# Altium schematic symbol library jlcpcb_2025_04_ferrites_extended_0603.schlib: 833 symbols (part 1 of 4)
Pins are listed as number, name and electrical type; pins without a type are passive.

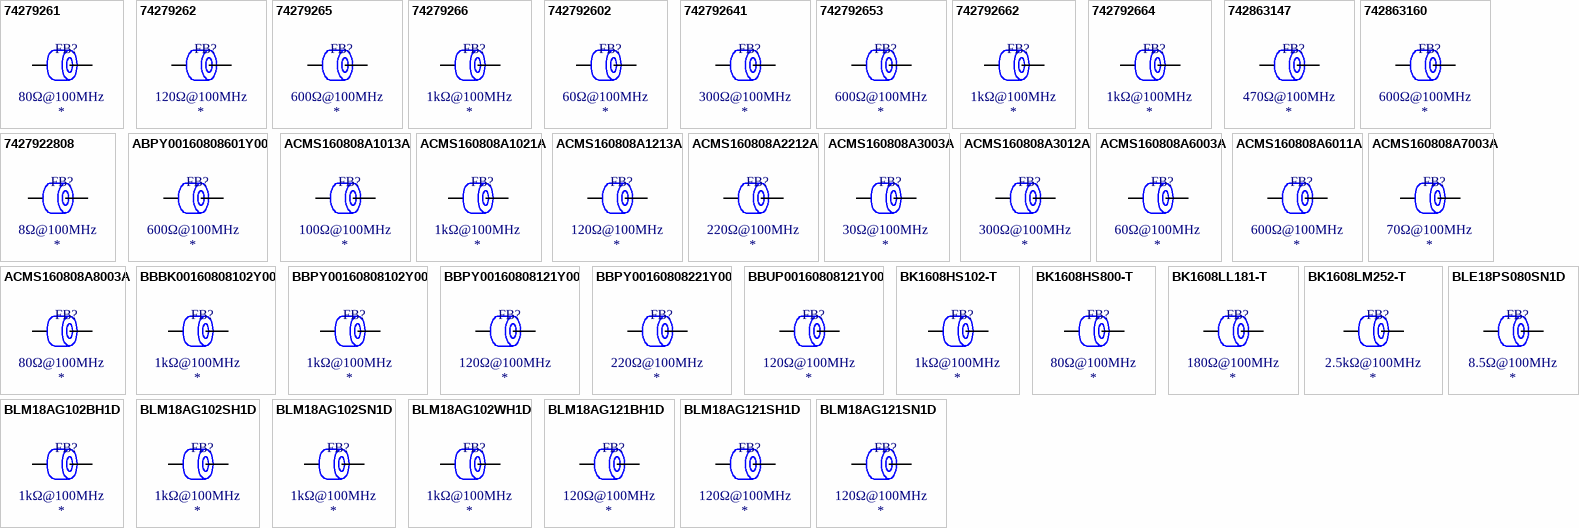
[diagram p0: symbols 74279261 to BLM18AG121SN1D]

## 74279261
designator FB?  Impedance @ Frequency: 80Ω@100MHz
Ferrite, 80Ω@100MHz, ±25%, 300mΩ, 1A, SMD 0603; Manufacturer: Wurth Elektronik; Manufacturer Part Number: 74279261; Package Size: 0603; JLCPCB Basic Part: No; JLCPCB Part Number: C2661853; Supplier 1: LCSC; Category: Ferrite Beads; Supplier Part Number 1: C2661853; Tolerance: ±25%; Rated Current: 1A; DC Resistance: 300mΩ; RoHS: Yes; ComponentLink1Description: Datasheet; ComponentLink1URL: https://wmsc.lcsc.com/wmsc/upload/file/pdf/v2/lcsc/2202131730_Wurth-Elektronik-74279261_C2661853.pdf; ComponentLink2Description: JLCPCB Part URL; ComponentLink2URL: https://jlcpcb.com/partdetail/C2661853; ComponentLink3Description: LCSC Part URL; ComponentLink3URL: https://lcsc.com/product-detail/Ferrite-Beads_Wurth-Elektronik-Wurth-Elektronik-74279261_C2661853.html
footprint FB-0603 (0603 (1608M) Ferrite)
pins: 1, 2

## 74279262
designator FB?  Impedance @ Frequency: 120Ω@100MHz
Ferrite, 120Ω@100MHz, ±25%, 300mΩ, 1.35A, SMD 0603; Manufacturer: Wurth Elektronik; Manufacturer Part Number: 74279262; Package Size: 0603; JLCPCB Basic Part: No; JLCPCB Part Number: C2661432; Supplier 1: LCSC; Category: Ferrite Beads; Supplier Part Number 1: C2661432; Tolerance: ±25%; Rated Current: 1.35A; DC Resistance: 300mΩ; RoHS: Yes; ComponentLink1Description: Datasheet; ComponentLink1URL: https://wmsc.lcsc.com/wmsc/upload/file/pdf/v2/lcsc/2106080004_Wurth-Elektronik-74279262_C2661432.pdf; ComponentLink2Description: JLCPCB Part URL; ComponentLink2URL: https://jlcpcb.com/partdetail/C2661432; ComponentLink3Description: LCSC Part URL; ComponentLink3URL: https://lcsc.com/product-detail/Ferrite-Beads_Wurth-Elektronik-Wurth-Elektronik-74279262_C2661432.html
footprint FB-0603 (0603 (1608M) Ferrite)
pins: 1, 2

## 74279265
designator FB?  Impedance @ Frequency: 600Ω@100MHz
Ferrite, 600Ω@100MHz, ±25%, 450mΩ, 850mA, SMD 0603; Manufacturer: Wurth Elektronik; Manufacturer Part Number: 74279265; Package Size: 0603; JLCPCB Basic Part: No; JLCPCB Part Number: C2661703; Supplier 1: LCSC; Category: Ferrite Beads; Supplier Part Number 1: C2661703; Tolerance: ±25%; Rated Current: 850mA; DC Resistance: 450mΩ; RoHS: Yes; ComponentLink1Description: Datasheet; ComponentLink1URL: https://wmsc.lcsc.com/wmsc/upload/file/pdf/v2/lcsc/2106071805_Wurth-Elektronik-74279265_C2661703.pdf; ComponentLink2Description: JLCPCB Part URL; ComponentLink2URL: https://jlcpcb.com/partdetail/C2661703; ComponentLink3Description: LCSC Part URL; ComponentLink3URL: https://lcsc.com/product-detail/Ferrite-Beads_Wurth-Elektronik-Wurth-Elektronik-74279265_C2661703.html
footprint FB-0603 (0603 (1608M) Ferrite)
pins: 1, 2

## 74279266
designator FB?  Impedance @ Frequency: 1kΩ@100MHz
Ferrite, 1kΩ@100MHz, ±25%, 600mΩ, 650mA, SMD 0603; Manufacturer: Wurth Elektronik; Manufacturer Part Number: 74279266; Package Size: 0603; JLCPCB Basic Part: No; JLCPCB Part Number: C2649309; Supplier 1: LCSC; Category: Ferrite Beads; Supplier Part Number 1: C2649309; Tolerance: ±25%; Rated Current: 650mA; DC Resistance: 600mΩ; RoHS: Yes; ComponentLink1Description: Datasheet; ComponentLink1URL: https://wmsc.lcsc.com/wmsc/upload/file/pdf/v2/lcsc/2108070630_Wurth-Elektronik-74279266_C2649309.pdf; ComponentLink2Description: JLCPCB Part URL; ComponentLink2URL: https://jlcpcb.com/partdetail/C2649309; ComponentLink3Description: LCSC Part URL; ComponentLink3URL: https://lcsc.com/product-detail/Ferrite-Beads_Wurth-Elektronik-Wurth-Elektronik-74279266_C2649309.html
footprint FB-0603 (0603 (1608M) Ferrite)
pins: 1, 2

## 742792602
designator FB?  Impedance @ Frequency: 60Ω@100MHz
Ferrite, 60Ω@100MHz, ±25%, 40mΩ, 3A, SMD 0603; Manufacturer: Wurth Elektronik; Manufacturer Part Number: 742792602; Package Size: 0603; JLCPCB Basic Part: No; JLCPCB Part Number: C2661495; Supplier 1: LCSC; Category: Ferrite Beads; Supplier Part Number 1: C2661495; Tolerance: ±25%; Rated Current: 3A; DC Resistance: 40mΩ; RoHS: Yes; ComponentLink1Description: Datasheet; ComponentLink1URL: https://wmsc.lcsc.com/wmsc/upload/file/pdf/v2/lcsc/2106071806_Wurth-Elektronik-742792602_C2661495.pdf; ComponentLink2Description: JLCPCB Part URL; ComponentLink2URL: https://jlcpcb.com/partdetail/C2661495; ComponentLink3Description: LCSC Part URL; ComponentLink3URL: https://lcsc.com/product-detail/Ferrite-Beads_Wurth-Elektronik-Wurth-Elektronik-742792602_C2661495.html
footprint FB-0603 (0603 (1608M) Ferrite)
pins: 1, 2

## 742792641
designator FB?  Impedance @ Frequency: 300Ω@100MHz
Ferrite, 300Ω@100MHz, ±25%, 150mΩ, 2A, SMD 0603; Manufacturer: Wurth Elektronik; Manufacturer Part Number: 742792641; Package Size: 0603; JLCPCB Basic Part: No; JLCPCB Part Number: C2649308; Supplier 1: LCSC; Category: Ferrite Beads; Supplier Part Number 1: C2649308; Tolerance: ±25%; Rated Current: 2A; DC Resistance: 150mΩ; RoHS: Yes; ComponentLink1Description: Datasheet; ComponentLink1URL: https://wmsc.lcsc.com/wmsc/upload/file/pdf/v2/lcsc/2106080533_Wurth-Elektronik-742792641_C2649308.pdf; ComponentLink2Description: JLCPCB Part URL; ComponentLink2URL: https://jlcpcb.com/partdetail/C2649308; ComponentLink3Description: LCSC Part URL; ComponentLink3URL: https://lcsc.com/product-detail/Ferrite-Beads_Wurth-Elektronik-Wurth-Elektronik-742792641_C2649308.html
footprint FB-0603 (0603 (1608M) Ferrite)
pins: 1, 2

## 742792653
designator FB?  Impedance @ Frequency: 600Ω@100MHz
Ferrite, 600Ω@100MHz, ±25%, 650mΩ, 500mA, SMD 0603; Manufacturer: Wurth Elektronik; Manufacturer Part Number: 742792653; Package Size: 0603; JLCPCB Basic Part: No; JLCPCB Part Number: C2661765; Supplier 1: LCSC; Category: Ferrite Beads; Supplier Part Number 1: C2661765; Tolerance: ±25%; Rated Current: 500mA; DC Resistance: 650mΩ; RoHS: Yes; ComponentLink1Description: Datasheet; ComponentLink1URL: https://wmsc.lcsc.com/wmsc/upload/file/pdf/v2/lcsc/2108070930_Wurth-Elektronik-742792653_C2661765.pdf; ComponentLink2Description: JLCPCB Part URL; ComponentLink2URL: https://jlcpcb.com/partdetail/C2661765; ComponentLink3Description: LCSC Part URL; ComponentLink3URL: https://lcsc.com/product-detail/Ferrite-Beads_Wurth-Elektronik-Wurth-Elektronik-742792653_C2661765.html
footprint FB-0603 (0603 (1608M) Ferrite)
pins: 1, 2

## 742792662
designator FB?  Impedance @ Frequency: 1kΩ@100MHz
Ferrite, 1kΩ@100MHz, ±25%, 300mΩ, 830mA, SMD 0603; Manufacturer: Wurth Elektronik; Manufacturer Part Number: 742792662; Package Size: 0603; JLCPCB Basic Part: No; JLCPCB Part Number: C2649307; Supplier 1: LCSC; Category: Ferrite Beads; Supplier Part Number 1: C2649307; Tolerance: ±25%; Rated Current: 830mA; DC Resistance: 300mΩ; RoHS: Yes; ComponentLink1Description: Datasheet; ComponentLink1URL: https://wmsc.lcsc.com/wmsc/upload/file/pdf/v2/lcsc/2106080533_Wurth-Elektronik-742792662_C2649307.pdf; ComponentLink2Description: JLCPCB Part URL; ComponentLink2URL: https://jlcpcb.com/partdetail/C2649307; ComponentLink3Description: LCSC Part URL; ComponentLink3URL: https://lcsc.com/product-detail/Ferrite-Beads_Wurth-Elektronik-Wurth-Elektronik-742792662_C2649307.html
footprint FB-0603 (0603 (1608M) Ferrite)
pins: 1, 2

## 742792664
designator FB?  Impedance @ Frequency: 1kΩ@100MHz
Ferrite, 1kΩ@100MHz, ±25%, 600mΩ, 680mA, SMD 0603; Manufacturer: Wurth Elektronik; Manufacturer Part Number: 742792664; Package Size: 0603; JLCPCB Basic Part: No; JLCPCB Part Number: C2661500; Supplier 1: LCSC; Category: Ferrite Beads; Supplier Part Number 1: C2661500; Tolerance: ±25%; Rated Current: 680mA; DC Resistance: 600mΩ; RoHS: Yes; ComponentLink1Description: Datasheet; ComponentLink1URL: https://wmsc.lcsc.com/wmsc/upload/file/pdf/v2/lcsc/2106071806_Wurth-Elektronik-742792664_C2661500.pdf; ComponentLink2Description: JLCPCB Part URL; ComponentLink2URL: https://jlcpcb.com/partdetail/C2661500; ComponentLink3Description: LCSC Part URL; ComponentLink3URL: https://lcsc.com/product-detail/Ferrite-Beads_Wurth-Elektronik-Wurth-Elektronik-742792664_C2661500.html
footprint FB-0603 (0603 (1608M) Ferrite)
pins: 1, 2

## 742863147
designator FB?  Impedance @ Frequency: 470Ω@100MHz
Ferrite, 470Ω@100MHz, ±25%, 320mΩ, 750mA, SMD 0603; Manufacturer: Wurth Elektronik; Manufacturer Part Number: 742863147; Package Size: 0603; JLCPCB Basic Part: No; JLCPCB Part Number: C2661419; Supplier 1: LCSC; Category: Ferrite Beads; Supplier Part Number 1: C2661419; Tolerance: ±25%; Rated Current: 750mA; DC Resistance: 320mΩ; RoHS: Yes; ComponentLink1Description: Datasheet; ComponentLink1URL: https://wmsc.lcsc.com/wmsc/upload/file/pdf/v2/lcsc/2106071807_Wurth-Elektronik-742863147_C2661419.pdf; ComponentLink2Description: JLCPCB Part URL; ComponentLink2URL: https://jlcpcb.com/partdetail/C2661419; ComponentLink3Description: LCSC Part URL; ComponentLink3URL: https://lcsc.com/product-detail/Ferrite-Beads_Wurth-Elektronik-Wurth-Elektronik-742863147_C2661419.html
footprint FB-0603 (0603 (1608M) Ferrite)
pins: 1, 2

## 742863160
designator FB?  Impedance @ Frequency: 600Ω@100MHz
Ferrite, 600Ω@100MHz, ±25%, 350mΩ, 500mA, SMD 0603; Manufacturer: Wurth Elektronik; Manufacturer Part Number: 742863160; Package Size: 0603; JLCPCB Basic Part: No; JLCPCB Part Number: C2650942; Supplier 1: LCSC; Category: Ferrite Beads; Supplier Part Number 1: C2650942; Tolerance: ±25%; Rated Current: 500mA; DC Resistance: 350mΩ; RoHS: Yes; ComponentLink1Description: Datasheet; ComponentLink1URL: https://wmsc.lcsc.com/wmsc/upload/file/pdf/v2/lcsc/2108070630_Wurth-Elektronik-742863160_C2650942.pdf; ComponentLink2Description: JLCPCB Part URL; ComponentLink2URL: https://jlcpcb.com/partdetail/C2650942; ComponentLink3Description: LCSC Part URL; ComponentLink3URL: https://lcsc.com/product-detail/Ferrite-Beads_Wurth-Elektronik-Wurth-Elektronik-742863160_C2650942.html
footprint FB-0603 (0603 (1608M) Ferrite)
pins: 1, 2

## 7427922808
designator FB?  Impedance @ Frequency: 8Ω@100MHz
Ferrite, 8Ω@100MHz, ±25%, 5mΩ, 9.5A, SMD 0603; Manufacturer: Wurth Elektronik; Manufacturer Part Number: 7427922808; Package Size: 0603; JLCPCB Basic Part: No; JLCPCB Part Number: C2661810; Supplier 1: LCSC; Category: Ferrite Beads; Supplier Part Number 1: C2661810; Tolerance: ±25%; Rated Current: 9.5A; DC Resistance: 5mΩ; RoHS: Yes; ComponentLink1Description: Datasheet; ComponentLink1URL: https://wmsc.lcsc.com/wmsc/upload/file/pdf/v2/lcsc/2106071736_Wurth-Elektronik-7427922808_C2661810.pdf; ComponentLink2Description: JLCPCB Part URL; ComponentLink2URL: https://jlcpcb.com/partdetail/C2661810; ComponentLink3Description: LCSC Part URL; ComponentLink3URL: https://lcsc.com/product-detail/Ferrite-Beads_Wurth-Elektronik-Wurth-Elektronik-7427922808_C2661810.html
footprint FB-0603 (0603 (1608M) Ferrite)
pins: 1, 2

## ABPY00160808601Y00
designator FB?  Impedance @ Frequency: 600Ω@100MHz
Ferrite, 600Ω@100MHz, ±25%, 200mΩ, 1A, SMD 0603; Manufacturer: Chilisin Elec; Manufacturer Part Number: ABPY00160808601Y00; Package Size: 0603; JLCPCB Basic Part: No; JLCPCB Part Number: C2847076; Supplier 1: LCSC; Category: Ferrite Beads; Supplier Part Number 1: C2847076; Tolerance: ±25%; Rated Current: 1A; DC Resistance: 200mΩ; RoHS: Yes; ComponentLink1Description: Datasheet; ComponentLink1URL: https://wmsc.lcsc.com/wmsc/upload/file/pdf/v2/lcsc/2108142130_Chilisin-Elec-ABPY00160808601Y00_C2847076.pdf; ComponentLink2Description: JLCPCB Part URL; ComponentLink2URL: https://jlcpcb.com/partdetail/C2847076; ComponentLink3Description: LCSC Part URL; ComponentLink3URL: https://lcsc.com/product-detail/Ferrite-Beads_Chilisin-Elec-Chilisin-Elec-ABPY00160808601Y00_C2847076.html
footprint FB-0603 (0603 (1608M) Ferrite)
pins: 1, 2

## ACMS160808A1013A
designator FB?  Impedance @ Frequency: 100Ω@100MHz
Ferrite, 100Ω@100MHz, ±25%, 50mΩ, 3A, SMD 0603; Manufacturer: HYHONGYEX; Manufacturer Part Number: ACMS160808A1013A; Package Size: 0603; JLCPCB Basic Part: No; JLCPCB Part Number: C963864; Supplier 1: LCSC; Category: Ferrite Beads; Supplier Part Number 1: C963864; Tolerance: ±25%; Rated Current: 3A; DC Resistance: 50mΩ; RoHS: Yes; ComponentLink1Description: Datasheet; ComponentLink2Description: JLCPCB Part URL; ComponentLink2URL: https://jlcpcb.com/partdetail/C963864; ComponentLink3Description: LCSC Part URL; ComponentLink3URL: https://lcsc.com/product-detail/Ferrite-Beads_HYHONGYEX-HYHONGYEX-ACMS160808A1013A_C963864.html
footprint FB-0603 (0603 (1608M) Ferrite)
pins: 1, 2

## ACMS160808A1021A
designator FB?  Impedance @ Frequency: 1kΩ@100MHz
Ferrite, 1kΩ@100MHz, ±25%, 250mΩ, 1A, SMD 0603; Manufacturer: HYHONGYEX; Manufacturer Part Number: ACMS160808A1021A; Package Size: 0603; JLCPCB Basic Part: No; JLCPCB Part Number: C963869; Supplier 1: LCSC; Category: Ferrite Beads; Supplier Part Number 1: C963869; Tolerance: ±25%; Rated Current: 1A; DC Resistance: 250mΩ; RoHS: Yes; ComponentLink1Description: Datasheet; ComponentLink1URL: https://wmsc.lcsc.com/wmsc/upload/file/pdf/v2/lcsc/2012171840_HYHONGYEX-ACMS160808A1021A_C963869.pdf; ComponentLink2Description: JLCPCB Part URL; ComponentLink2URL: https://jlcpcb.com/partdetail/C963869; ComponentLink3Description: LCSC Part URL; ComponentLink3URL: https://lcsc.com/product-detail/Ferrite-Beads_HYHONGYEX-HYHONGYEX-ACMS160808A1021A_C963869.html
footprint FB-0603 (0603 (1608M) Ferrite)
pins: 1, 2

## ACMS160808A1213A
designator FB?  Impedance @ Frequency: 120Ω@100MHz
Ferrite, 120Ω@100MHz, ±25%, 50mΩ, 3A, SMD 0603; Manufacturer: HYHONGYEX; Manufacturer Part Number: ACMS160808A1213A; Package Size: 0603; JLCPCB Basic Part: No; JLCPCB Part Number: C963865; Supplier 1: LCSC; Category: Ferrite Beads; Supplier Part Number 1: C963865; Tolerance: ±25%; Rated Current: 3A; DC Resistance: 50mΩ; RoHS: Yes; ComponentLink1Description: Datasheet; ComponentLink1URL: https://wmsc.lcsc.com/wmsc/upload/file/pdf/v2/lcsc/2012171840_HYHONGYEX-ACMS160808A1213A_C963865.pdf; ComponentLink2Description: JLCPCB Part URL; ComponentLink2URL: https://jlcpcb.com/partdetail/C963865; ComponentLink3Description: LCSC Part URL; ComponentLink3URL: https://lcsc.com/product-detail/Ferrite-Beads_HYHONGYEX-HYHONGYEX-ACMS160808A1213A_C963865.html
footprint FB-0603 (0603 (1608M) Ferrite)
pins: 1, 2

## ACMS160808A2212A
designator FB?  Impedance @ Frequency: 220Ω@100MHz
Ferrite, 220Ω@100MHz, ±25%, 100mΩ, 2A, SMD 0603; Manufacturer: HYHONGYEX; Manufacturer Part Number: ACMS160808A2212A; Package Size: 0603; JLCPCB Basic Part: No; JLCPCB Part Number: C963866; Supplier 1: LCSC; Category: Ferrite Beads; Supplier Part Number 1: C963866; Tolerance: ±25%; Rated Current: 2A; DC Resistance: 100mΩ; RoHS: Yes; ComponentLink1Description: Datasheet; ComponentLink1URL: https://wmsc.lcsc.com/wmsc/upload/file/pdf/v2/lcsc/2012171840_HYHONGYEX-ACMS160808A2212A_C963866.pdf; ComponentLink2Description: JLCPCB Part URL; ComponentLink2URL: https://jlcpcb.com/partdetail/C963866; ComponentLink3Description: LCSC Part URL; ComponentLink3URL: https://lcsc.com/product-detail/Ferrite-Beads_HYHONGYEX-HYHONGYEX-ACMS160808A2212A_C963866.html
footprint FB-0603 (0603 (1608M) Ferrite)
pins: 1, 2

## ACMS160808A3003A
designator FB?  Impedance @ Frequency: 30Ω@100MHz
Ferrite, 30Ω@100MHz, ±25%, 40mΩ, 3A, SMD 0603; Manufacturer: HYHONGYEX; Manufacturer Part Number: ACMS160808A3003A; Package Size: 0603; JLCPCB Basic Part: No; JLCPCB Part Number: C963860; Supplier 1: LCSC; Category: Ferrite Beads; Supplier Part Number 1: C963860; Tolerance: ±25%; Rated Current: 3A; DC Resistance: 40mΩ; RoHS: Yes; ComponentLink1Description: Datasheet; ComponentLink1URL: https://wmsc.lcsc.com/wmsc/upload/file/pdf/v2/lcsc/2012171840_HYHONGYEX-ACMS160808A3003A_C963860.pdf; ComponentLink2Description: JLCPCB Part URL; ComponentLink2URL: https://jlcpcb.com/partdetail/C963860; ComponentLink3Description: LCSC Part URL; ComponentLink3URL: https://lcsc.com/product-detail/Ferrite-Beads_HYHONGYEX-HYHONGYEX-ACMS160808A3003A_C963860.html
footprint FB-0603 (0603 (1608M) Ferrite)
pins: 1, 2

## ACMS160808A3012A
designator FB?  Impedance @ Frequency: 300Ω@100MHz
Ferrite, 300Ω@100MHz, ±25%, 150mΩ, 2A, SMD 0603; Manufacturer: HYHONGYEX; Manufacturer Part Number: ACMS160808A3012A; Package Size: 0603; JLCPCB Basic Part: No; JLCPCB Part Number: C963867; Supplier 1: LCSC; Category: Ferrite Beads; Supplier Part Number 1: C963867; Tolerance: ±25%; Rated Current: 2A; DC Resistance: 150mΩ; RoHS: Yes; ComponentLink1Description: Datasheet; ComponentLink1URL: https://wmsc.lcsc.com/wmsc/upload/file/pdf/v2/lcsc/2012171840_HYHONGYEX-ACMS160808A3012A_C963867.pdf; ComponentLink2Description: JLCPCB Part URL; ComponentLink2URL: https://jlcpcb.com/partdetail/C963867; ComponentLink3Description: LCSC Part URL; ComponentLink3URL: https://lcsc.com/product-detail/Ferrite-Beads_HYHONGYEX-HYHONGYEX-ACMS160808A3012A_C963867.html
footprint FB-0603 (0603 (1608M) Ferrite)
pins: 1, 2

## ACMS160808A6003A
designator FB?  Impedance @ Frequency: 60Ω@100MHz
Ferrite, 60Ω@100MHz, ±25%, 40mΩ, 3A, SMD 0603; Manufacturer: HYHONGYEX; Manufacturer Part Number: ACMS160808A6003A; Package Size: 0603; JLCPCB Basic Part: No; JLCPCB Part Number: C963861; Supplier 1: LCSC; Category: Ferrite Beads; Supplier Part Number 1: C963861; Tolerance: ±25%; Rated Current: 3A; DC Resistance: 40mΩ; RoHS: Yes; ComponentLink1Description: Datasheet; ComponentLink1URL: https://wmsc.lcsc.com/wmsc/upload/file/pdf/v2/lcsc/2012171840_HYHONGYEX-ACMS160808A6003A_C963861.pdf; ComponentLink2Description: JLCPCB Part URL; ComponentLink2URL: https://jlcpcb.com/partdetail/C963861; ComponentLink3Description: LCSC Part URL; ComponentLink3URL: https://lcsc.com/product-detail/Ferrite-Beads_HYHONGYEX-HYHONGYEX-ACMS160808A6003A_C963861.html
footprint FB-0603 (0603 (1608M) Ferrite)
pins: 1, 2

## ACMS160808A6011A
designator FB?  Impedance @ Frequency: 600Ω@100MHz
Ferrite, 600Ω@100MHz, ±25%, 200mΩ, 1A, SMD 0603; Manufacturer: HYHONGYEX; Manufacturer Part Number: ACMS160808A6011A; Package Size: 0603; JLCPCB Basic Part: No; JLCPCB Part Number: C963868; Supplier 1: LCSC; Category: Ferrite Beads; Supplier Part Number 1: C963868; Tolerance: ±25%; Rated Current: 1A; DC Resistance: 200mΩ; RoHS: Yes; ComponentLink1Description: Datasheet; ComponentLink1URL: https://wmsc.lcsc.com/wmsc/upload/file/pdf/v2/lcsc/2012171840_HYHONGYEX-ACMS160808A6011A_C963868.pdf; ComponentLink2Description: JLCPCB Part URL; ComponentLink2URL: https://jlcpcb.com/partdetail/C963868; ComponentLink3Description: LCSC Part URL; ComponentLink3URL: https://lcsc.com/product-detail/Ferrite-Beads_HYHONGYEX-HYHONGYEX-ACMS160808A6011A_C963868.html
footprint FB-0603 (0603 (1608M) Ferrite)
pins: 1, 2

## ACMS160808A7003A
designator FB?  Impedance @ Frequency: 70Ω@100MHz
Ferrite, 70Ω@100MHz, ±25%, 40mΩ, 3A, SMD 0603; Manufacturer: HYHONGYEX; Manufacturer Part Number: ACMS160808A7003A; Package Size: 0603; JLCPCB Basic Part: No; JLCPCB Part Number: C963862; Supplier 1: LCSC; Category: Ferrite Beads; Supplier Part Number 1: C963862; Tolerance: ±25%; Rated Current: 3A; DC Resistance: 40mΩ; RoHS: Yes; ComponentLink1Description: Datasheet; ComponentLink1URL: https://wmsc.lcsc.com/wmsc/upload/file/pdf/v2/lcsc/2012171840_HYHONGYEX-ACMS160808A7003A_C963862.pdf; ComponentLink2Description: JLCPCB Part URL; ComponentLink2URL: https://jlcpcb.com/partdetail/C963862; ComponentLink3Description: LCSC Part URL; ComponentLink3URL: https://lcsc.com/product-detail/Ferrite-Beads_HYHONGYEX-HYHONGYEX-ACMS160808A7003A_C963862.html
footprint FB-0603 (0603 (1608M) Ferrite)
pins: 1, 2

## ACMS160808A8003A
designator FB?  Impedance @ Frequency: 80Ω@100MHz
Ferrite, 80Ω@100MHz, ±25%, 40mΩ, 3A, SMD 0603; Manufacturer: HYHONGYEX; Manufacturer Part Number: ACMS160808A8003A; Package Size: 0603; JLCPCB Basic Part: No; JLCPCB Part Number: C963863; Supplier 1: LCSC; Category: Ferrite Beads; Supplier Part Number 1: C963863; Tolerance: ±25%; Rated Current: 3A; DC Resistance: 40mΩ; RoHS: Yes; ComponentLink1Description: Datasheet; ComponentLink1URL: https://wmsc.lcsc.com/wmsc/upload/file/pdf/v2/lcsc/2012171840_HYHONGYEX-ACMS160808A8003A_C963863.pdf; ComponentLink2Description: JLCPCB Part URL; ComponentLink2URL: https://jlcpcb.com/partdetail/C963863; ComponentLink3Description: LCSC Part URL; ComponentLink3URL: https://lcsc.com/product-detail/Ferrite-Beads_HYHONGYEX-HYHONGYEX-ACMS160808A8003A_C963863.html
footprint FB-0603 (0603 (1608M) Ferrite)
pins: 1, 2

## BBBK00160808102Y00
designator FB?  Impedance @ Frequency: 1kΩ@100MHz
Ferrite, 1kΩ@100MHz, ±25%, 600mΩ, 300mA, SMD 0603; Manufacturer: Chilisin Elec; Manufacturer Part Number: BBBK00160808102Y00; Package Size: 0603; JLCPCB Basic Part: No; JLCPCB Part Number: C2847083; Supplier 1: LCSC; Category: Ferrite Beads; Supplier Part Number 1: C2847083; Tolerance: ±25%; Rated Current: 300mA; DC Resistance: 600mΩ; RoHS: Yes; ComponentLink1Description: Datasheet; ComponentLink1URL: https://wmsc.lcsc.com/wmsc/upload/file/pdf/v2/lcsc/2108191930_Chilisin-Elec-BBBK00160808102Y00_C2847083.pdf; ComponentLink2Description: JLCPCB Part URL; ComponentLink2URL: https://jlcpcb.com/partdetail/C2847083; ComponentLink3Description: LCSC Part URL; ComponentLink3URL: https://lcsc.com/product-detail/Ferrite-Beads_Chilisin-Elec-Chilisin-Elec-BBBK00160808102Y00_C2847083.html
footprint FB-0603 (0603 (1608M) Ferrite)
pins: 1, 2

## BBPY00160808102Y00
designator FB?  Impedance @ Frequency: 1kΩ@100MHz
Ferrite, 1kΩ@100MHz, 250mΩ, SMD 0603; Manufacturer: Chilisin Elec; Manufacturer Part Number: BBPY00160808102Y00; Package Size: 0603; JLCPCB Basic Part: No; JLCPCB Part Number: C2838401; Supplier 1: LCSC; Category: Ferrite Beads; Supplier Part Number 1: C2838401; DC Resistance: 250mΩ; RoHS: Yes; ComponentLink1Description: Datasheet; ComponentLink1URL: https://wmsc.lcsc.com/wmsc/upload/file/pdf/v2/lcsc/2201141500_Chilisin-Elec-BBPY00160808102Y00_C2838401.pdf; ComponentLink2Description: JLCPCB Part URL; ComponentLink2URL: https://jlcpcb.com/partdetail/C2838401; ComponentLink3Description: LCSC Part URL; ComponentLink3URL: https://lcsc.com/product-detail/Ferrite-Beads_Chilisin-Elec-Chilisin-Elec-BBPY00160808102Y00_C2838401.html
pins: 1, 2

## BBPY00160808121Y00
designator FB?  Impedance @ Frequency: 120Ω@100MHz
Ferrite, 120Ω@100MHz, ±25%, 0.08Ω, 2.5A, SMD 0603; Manufacturer: Chilisin Elec; Manufacturer Part Number: BBPY00160808121Y00; Package Size: 0603; JLCPCB Basic Part: No; JLCPCB Part Number: C2913755; Supplier 1: LCSC; Category: Ferrite Beads; Supplier Part Number 1: C2913755; Tolerance: ±25%; Rated Current: 2.5A; DC Resistance: 0.08Ω; RoHS: Yes; ComponentLink1Description: Datasheet; ComponentLink1URL: https://wmsc.lcsc.com/wmsc/upload/file/pdf/v2/lcsc/2111011830_Chilisin-Elec-BBPY00160808121Y00_C2913755.pdf; ComponentLink2Description: JLCPCB Part URL; ComponentLink2URL: https://jlcpcb.com/partdetail/C2913755; ComponentLink3Description: LCSC Part URL; ComponentLink3URL: https://lcsc.com/product-detail/Ferrite-Beads_Chilisin-Elec-Chilisin-Elec-BBPY00160808121Y00_C2913755.html
footprint FB-0603 (0603 (1608M) Ferrite)
pins: 1, 2

## BBPY00160808221Y00
designator FB?  Impedance @ Frequency: 220Ω@100MHz
Ferrite, 220Ω@100MHz, ±25%, 100mΩ, 2A, SMD 0603; Manufacturer: Chilisin Elec; Manufacturer Part Number: BBPY00160808221Y00; Package Size: 0603; JLCPCB Basic Part: No; JLCPCB Part Number: C2981196; Supplier 1: LCSC; Category: Ferrite Beads; Supplier Part Number 1: C2981196; Tolerance: ±25%; Rated Current: 2A; DC Resistance: 100mΩ; RoHS: Yes; ComponentLink1Description: Datasheet; ComponentLink1URL: https://wmsc.lcsc.com/wmsc/upload/file/pdf/v2/lcsc/2203101903_Chilisin-Elec-BBPY00160808221Y00_C2981196.pdf; ComponentLink2Description: JLCPCB Part URL; ComponentLink2URL: https://jlcpcb.com/partdetail/C2981196; ComponentLink3Description: LCSC Part URL; ComponentLink3URL: https://lcsc.com/product-detail/Ferrite-Beads_Chilisin-Elec-Chilisin-Elec-BBPY00160808221Y00_C2981196.html
footprint FB-0603 (0603 (1608M) Ferrite)
pins: 1, 2

## BBUP00160808121Y00
designator FB?  Impedance @ Frequency: 120Ω@100MHz
Ferrite, 120Ω@100MHz, ±25%, 30mΩ, 3A, SMD 0603; Manufacturer: Chilisin Elec; Manufacturer Part Number: BBUP00160808121Y00; Package Size: 0603; JLCPCB Basic Part: No; JLCPCB Part Number: C2847088; Supplier 1: LCSC; Category: Ferrite Beads; Supplier Part Number 1: C2847088; Tolerance: ±25%; Rated Current: 3A; DC Resistance: 30mΩ; RoHS: Yes; ComponentLink1Description: Datasheet; ComponentLink1URL: https://wmsc.lcsc.com/wmsc/upload/file/pdf/v2/lcsc/2109081230_Chilisin-Elec-BBUP00160808121Y00_C2847088.pdf; ComponentLink2Description: JLCPCB Part URL; ComponentLink2URL: https://jlcpcb.com/partdetail/C2847088; ComponentLink3Description: LCSC Part URL; ComponentLink3URL: https://lcsc.com/product-detail/Ferrite-Beads_Chilisin-Elec-Chilisin-Elec-BBUP00160808121Y00_C2847088.html
footprint FB-0603 (0603 (1608M) Ferrite)
pins: 1, 2

## BK1608HS102-T
designator FB?  Impedance @ Frequency: 1kΩ@100MHz
Ferrite, 1kΩ@100MHz, ±25%, 600mΩ, 300mA, SMD 0603; Manufacturer: Taiyo Yuden; Manufacturer Part Number: BK1608HS102-T; Package Size: 0603; JLCPCB Basic Part: No; JLCPCB Part Number: C454079; Supplier 1: LCSC; Category: Ferrite Beads; Supplier Part Number 1: C454079; Tolerance: ±25%; Rated Current: 300mA; DC Resistance: 600mΩ; RoHS: Yes; ComponentLink1Description: Datasheet; ComponentLink1URL: https://wmsc.lcsc.com/wmsc/upload/file/pdf/v2/lcsc/2304140030_Taiyo-Yuden-BK1608HS102-T_C454079.pdf; ComponentLink2Description: JLCPCB Part URL; ComponentLink2URL: https://jlcpcb.com/partdetail/C454079; ComponentLink3Description: LCSC Part URL; ComponentLink3URL: https://lcsc.com/product-detail/Ferrite-Beads_Taiyo-Yuden-Taiyo-Yuden-BK1608HS102-T_C454079.html
footprint FB-0603 (0603 (1608M) Ferrite)
pins: 1, 2

## BK1608HS800-T
designator FB?  Impedance @ Frequency: 80Ω@100MHz
Ferrite, 80Ω@100MHz, ±25%, 100mΩ, 600mA, SMD 0603; Manufacturer: Taiyo Yuden; Manufacturer Part Number: BK1608HS800-T; Package Size: 0603; JLCPCB Basic Part: No; JLCPCB Part Number: C90336; Supplier 1: LCSC; Category: Ferrite Beads; Supplier Part Number 1: C90336; Tolerance: ±25%; Rated Current: 600mA; DC Resistance: 100mΩ; RoHS: Yes; ComponentLink1Description: Datasheet; ComponentLink1URL: https://wmsc.lcsc.com/wmsc/upload/file/pdf/v2/lcsc/2304140030_Taiyo-Yuden-BK1608HS800-T_C90336.pdf; ComponentLink2Description: JLCPCB Part URL; ComponentLink2URL: https://jlcpcb.com/partdetail/C90336; ComponentLink3Description: LCSC Part URL; ComponentLink3URL: https://lcsc.com/product-detail/Ferrite-Beads_Taiyo-Yuden-Taiyo-Yuden-BK1608HS800-T_C90336.html
footprint FB-0603 (0603 (1608M) Ferrite)
pins: 1, 2

## BK1608LL181-T
designator FB?  Impedance @ Frequency: 180Ω@100MHz
Ferrite, 180Ω@100MHz, 650mΩ, SMD 0603; Manufacturer: Taiyo Yuden; Manufacturer Part Number: BK1608LL181-T; Package Size: 0603; JLCPCB Basic Part: No; JLCPCB Part Number: C524957; Supplier 1: LCSC; Category: Ferrite Beads; Supplier Part Number 1: C524957; DC Resistance: 650mΩ; RoHS: Yes; ComponentLink1Description: Datasheet; ComponentLink1URL: https://wmsc.lcsc.com/wmsc/upload/file/pdf/v2/lcsc/2211282200_Taiyo-Yuden-BK1608LL181-T_C524957.pdf; ComponentLink2Description: JLCPCB Part URL; ComponentLink2URL: https://jlcpcb.com/partdetail/C524957; ComponentLink3Description: LCSC Part URL; ComponentLink3URL: https://lcsc.com/product-detail/Ferrite-Beads_Taiyo-Yuden-Taiyo-Yuden-BK1608LL181-T_C524957.html
pins: 1, 2

## BK1608LM252-T
designator FB?  Impedance @ Frequency: 2.5kΩ@100MHz
Ferrite, 2.5kΩ@100MHz, ±25%, 1.1Ω, 200mA, SMD 0603; Manufacturer: Taiyo Yuden; Manufacturer Part Number: BK1608LM252-T; Package Size: 0603; JLCPCB Basic Part: No; JLCPCB Part Number: C267995; Supplier 1: LCSC; Category: Ferrite Beads; Supplier Part Number 1: C267995; Tolerance: ±25%; Rated Current: 200mA; DC Resistance: 1.1Ω; RoHS: Yes; ComponentLink1Description: Datasheet; ComponentLink1URL: https://wmsc.lcsc.com/wmsc/upload/file/pdf/v2/lcsc/2211282230_Taiyo-Yuden-BK1608LM252-T_C267995.pdf; ComponentLink2Description: JLCPCB Part URL; ComponentLink2URL: https://jlcpcb.com/partdetail/C267995; ComponentLink3Description: LCSC Part URL; ComponentLink3URL: https://lcsc.com/product-detail/Ferrite-Beads_Taiyo-Yuden-Taiyo-Yuden-BK1608LM252-T_C267995.html
footprint FB-0603 (0603 (1608M) Ferrite)
pins: 1, 2

## BLE18PS080SN1D
designator FB?  Impedance @ Frequency: 8.5Ω@100MHz
Ferrite, 8.5Ω@100MHz, 4mΩ, SMD 0603; Manufacturer: Murata Electronics; Manufacturer Part Number: BLE18PS080SN1D; Package Size: 0603; JLCPCB Basic Part: No; JLCPCB Part Number: C3764407; Supplier 1: LCSC; Category: Ferrite Beads; Supplier Part Number 1: C3764407; DC Resistance: 4mΩ; RoHS: Yes; ComponentLink1Description: Datasheet; ComponentLink1URL: https://wmsc.lcsc.com/wmsc/upload/file/pdf/v2/lcsc/2308111348_Murata-Electronics-BLE18PS080SN1D_C3764407.pdf; ComponentLink2Description: JLCPCB Part URL; ComponentLink2URL: https://jlcpcb.com/partdetail/C3764407; ComponentLink3Description: LCSC Part URL; ComponentLink3URL: https://lcsc.com/product-detail/Ferrite-Beads_Murata-Electronics-Murata-Electronics-BLE18PS080SN1D_C3764407.html
pins: 1, 2

## BLM18AG102BH1D
designator FB?  Impedance @ Frequency: 1kΩ@100MHz
Ferrite, 1kΩ@100MHz, ±25%, 500mΩ, 450mA, SMD 0603; Manufacturer: Murata Electronics; Manufacturer Part Number: BLM18AG102BH1D; Package Size: 0603; JLCPCB Basic Part: No; JLCPCB Part Number: C524528; Supplier 1: LCSC; Category: Ferrite Beads; Supplier Part Number 1: C524528; Tolerance: ±25%; Rated Current: 450mA; DC Resistance: 500mΩ; RoHS: Yes; ComponentLink1Description: Datasheet; ComponentLink1URL: https://wmsc.lcsc.com/wmsc/upload/file/pdf/v2/lcsc/2304140030_Murata-Electronics-BLM18AG102BH1D_C524528.pdf; ComponentLink2Description: JLCPCB Part URL; ComponentLink2URL: https://jlcpcb.com/partdetail/C524528; ComponentLink3Description: LCSC Part URL; ComponentLink3URL: https://lcsc.com/product-detail/Ferrite-Beads_Murata-Electronics-Murata-Electronics-BLM18AG102BH1D_C524528.html
footprint FB-0603 (0603 (1608M) Ferrite)
pins: 1, 2

## BLM18AG102SH1D
designator FB?  Impedance @ Frequency: 1kΩ@100MHz
Ferrite, 1kΩ@100MHz, ±25%, 500mΩ, 450mA, SMD 0603; Manufacturer: Murata Electronics; Manufacturer Part Number: BLM18AG102SH1D; Package Size: 0603; JLCPCB Basic Part: No; JLCPCB Part Number: C337877; Supplier 1: LCSC; Category: Ferrite Beads; Supplier Part Number 1: C337877; Tolerance: ±25%; Rated Current: 450mA; DC Resistance: 500mΩ; RoHS: Yes; ComponentLink1Description: Datasheet; ComponentLink1URL: https://wmsc.lcsc.com/wmsc/upload/file/pdf/v2/lcsc/1912111437_Murata-Electronics-BLM18AG102SH1D_C337877.pdf; ComponentLink2Description: JLCPCB Part URL; ComponentLink2URL: https://jlcpcb.com/partdetail/C337877; ComponentLink3Description: LCSC Part URL; ComponentLink3URL: https://lcsc.com/product-detail/Ferrite-Beads_Murata-Electronics-Murata-Electronics-BLM18AG102SH1D_C337877.html
footprint FB-0603 (0603 (1608M) Ferrite)
pins: 1, 2

## BLM18AG102SN1D
designator FB?  Impedance @ Frequency: 1kΩ@100MHz
Ferrite, 1kΩ@100MHz, ±25%, 500mΩ, 450mA, SMD 0603; Manufacturer: Murata Electronics; Manufacturer Part Number: BLM18AG102SN1D; Package Size: 0603; JLCPCB Basic Part: No; JLCPCB Part Number: C85824; Supplier 1: LCSC; Category: Ferrite Beads; Supplier Part Number 1: C85824; Tolerance: ±25%; Rated Current: 450mA; DC Resistance: 500mΩ; RoHS: Yes; ComponentLink1Description: Datasheet; ComponentLink1URL: https://wmsc.lcsc.com/wmsc/upload/file/pdf/v2/lcsc/2304140030_Murata-Electronics-BLM18AG102SN1D_C85824.pdf; ComponentLink2Description: JLCPCB Part URL; ComponentLink2URL: https://jlcpcb.com/partdetail/C85824; ComponentLink3Description: LCSC Part URL; ComponentLink3URL: https://lcsc.com/product-detail/Ferrite-Beads_Murata-Electronics-Murata-Electronics-BLM18AG102SN1D_C85824.html
footprint FB-0603 (0603 (1608M) Ferrite)
pins: 1, 2

## BLM18AG102WH1D
designator FB?  Impedance @ Frequency: 1kΩ@100MHz
Ferrite, 1kΩ@100MHz, ±25%, 700mΩ, 200mA, SMD 0603; Manufacturer: Murata Electronics; Manufacturer Part Number: BLM18AG102WH1D; Package Size: 0603; JLCPCB Basic Part: No; JLCPCB Part Number: C437399; Supplier 1: LCSC; Category: Ferrite Beads; Supplier Part Number 1: C437399; Tolerance: ±25%; Rated Current: 200mA; DC Resistance: 700mΩ; RoHS: Yes; ComponentLink1Description: Datasheet; ComponentLink1URL: https://wmsc.lcsc.com/wmsc/upload/file/pdf/v2/lcsc/2304140030_Murata-Electronics-BLM18AG102WH1D_C437399.pdf; ComponentLink2Description: JLCPCB Part URL; ComponentLink2URL: https://jlcpcb.com/partdetail/C437399; ComponentLink3Description: LCSC Part URL; ComponentLink3URL: https://lcsc.com/product-detail/Ferrite-Beads_Murata-Electronics-Murata-Electronics-BLM18AG102WH1D_C437399.html
footprint FB-0603 (0603 (1608M) Ferrite)
pins: 1, 2

## BLM18AG121BH1D
designator FB?  Impedance @ Frequency: 120Ω@100MHz
Ferrite, 120Ω@100MHz, ±25%, 180mΩ, 800mA, SMD 0603; Manufacturer: Murata Electronics; Manufacturer Part Number: BLM18AG121BH1D; Package Size: 0603; JLCPCB Basic Part: No; JLCPCB Part Number: C710349; Supplier 1: LCSC; Category: Ferrite Beads; Supplier Part Number 1: C710349; Tolerance: ±25%; Rated Current: 800mA; DC Resistance: 180mΩ; RoHS: Yes; ComponentLink1Description: Datasheet; ComponentLink1URL: https://wmsc.lcsc.com/wmsc/upload/file/pdf/v2/lcsc/2304140030_Murata-Electronics-BLM18AG121BH1D_C710349.pdf; ComponentLink2Description: JLCPCB Part URL; ComponentLink2URL: https://jlcpcb.com/partdetail/C710349; ComponentLink3Description: LCSC Part URL; ComponentLink3URL: https://lcsc.com/product-detail/Ferrite-Beads_Murata-Electronics-Murata-Electronics-BLM18AG121BH1D_C710349.html
footprint FB-0603 (0603 (1608M) Ferrite)
pins: 1, 2

## BLM18AG121SH1D
designator FB?  Impedance @ Frequency: 120Ω@100MHz
Ferrite, 120Ω@100MHz, ±25%, 180mΩ, 800mA, SMD 0603; Manufacturer: Murata Electronics; Manufacturer Part Number: BLM18AG121SH1D; Package Size: 0603; JLCPCB Basic Part: No; JLCPCB Part Number: C440129; Supplier 1: LCSC; Category: Ferrite Beads; Supplier Part Number 1: C440129; Tolerance: ±25%; Rated Current: 800mA; DC Resistance: 180mΩ; RoHS: Yes; ComponentLink1Description: Datasheet; ComponentLink1URL: https://wmsc.lcsc.com/wmsc/upload/file/pdf/v2/lcsc/2304140030_Murata-Electronics-BLM18AG121SH1D_C440129.pdf; ComponentLink2Description: JLCPCB Part URL; ComponentLink2URL: https://jlcpcb.com/partdetail/C440129; ComponentLink3Description: LCSC Part URL; ComponentLink3URL: https://lcsc.com/product-detail/Ferrite-Beads_Murata-Electronics-Murata-Electronics-BLM18AG121SH1D_C440129.html
footprint FB-0603 (0603 (1608M) Ferrite)
pins: 1, 2

## BLM18AG121SN1D
designator FB?  Impedance @ Frequency: 120Ω@100MHz
Ferrite, 120Ω@100MHz, ±25%, 180mΩ, 800mA, SMD 0603; Manufacturer: Murata Electronics; Manufacturer Part Number: BLM18AG121SN1D; Package Size: 0603; JLCPCB Basic Part: No; JLCPCB Part Number: C76892; Supplier 1: LCSC; Category: Ferrite Beads; Supplier Part Number 1: C76892; Tolerance: ±25%; Rated Current: 800mA; DC Resistance: 180mΩ; RoHS: Yes; ComponentLink1Description: Datasheet; ComponentLink1URL: https://wmsc.lcsc.com/wmsc/upload/file/pdf/v2/lcsc/2304140030_Murata-Electronics-BLM18AG121SN1D_C76892.pdf; ComponentLink2Description: JLCPCB Part URL; ComponentLink2URL: https://jlcpcb.com/partdetail/C76892; ComponentLink3Description: LCSC Part URL; ComponentLink3URL: https://lcsc.com/product-detail/Ferrite-Beads_Murata-Electronics-Murata-Electronics-BLM18AG121SN1D_C76892.html
footprint FB-0603 (0603 (1608M) Ferrite)
pins: 1, 2

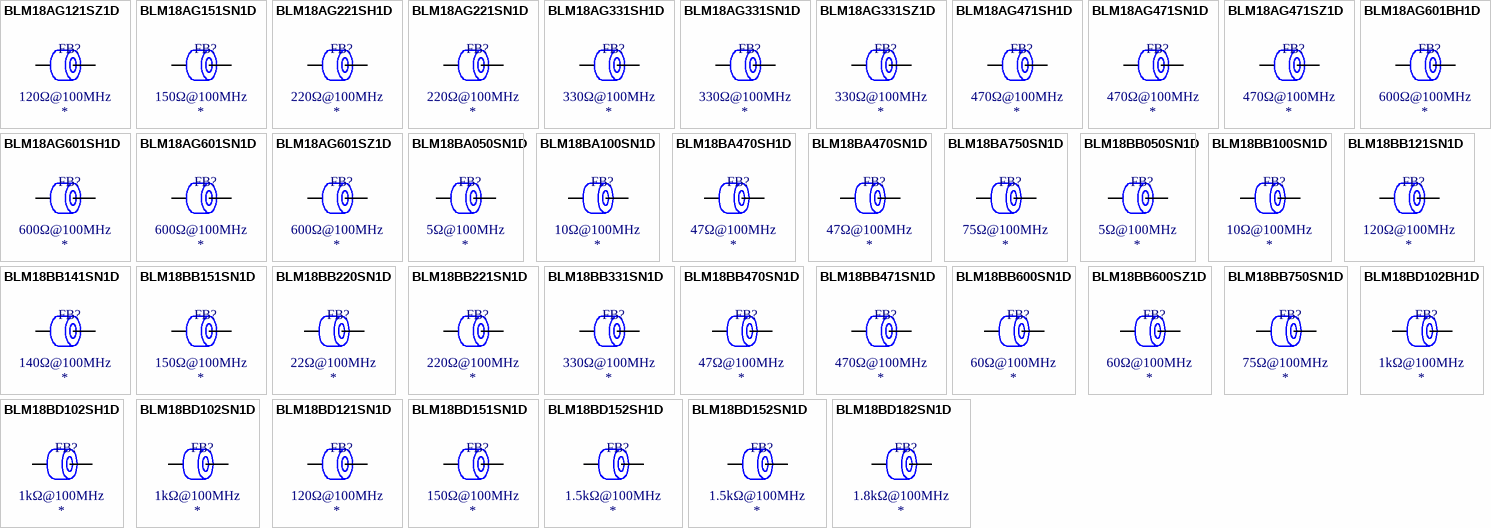
[diagram p1: symbols BLM18AG121SZ1D to BLM18BD182SN1D]

## BLM18AG121SZ1D
designator FB?  Impedance @ Frequency: 120Ω@100MHz
Ferrite, 120Ω@100MHz, 180mΩ, SMD 0603; Manufacturer: Murata Electronics; Manufacturer Part Number: BLM18AG121SZ1D; Package Size: 0603; JLCPCB Basic Part: No; JLCPCB Part Number: C2661834; Supplier 1: LCSC; Category: Ferrite Beads; Supplier Part Number 1: C2661834; DC Resistance: 180mΩ; RoHS: Yes; ComponentLink1Description: Datasheet; ComponentLink2Description: JLCPCB Part URL; ComponentLink2URL: https://jlcpcb.com/partdetail/C2661834; ComponentLink3Description: LCSC Part URL; ComponentLink3URL: https://lcsc.com/product-detail/Ferrite-Beads_Murata-Electronics-Murata-Electronics-BLM18AG121SZ1D_C2661834.html
pins: 1, 2

## BLM18AG151SN1D
designator FB?  Impedance @ Frequency: 150Ω@100MHz
Ferrite, 150Ω@100MHz, ±25%, 250mΩ, 700mA, SMD 0603; Manufacturer: Murata Electronics; Manufacturer Part Number: BLM18AG151SN1D; Package Size: 0603; JLCPCB Basic Part: No; JLCPCB Part Number: C337878; Supplier 1: LCSC; Category: Ferrite Beads; Supplier Part Number 1: C337878; Tolerance: ±25%; Rated Current: 700mA; DC Resistance: 250mΩ; RoHS: Yes; ComponentLink1Description: Datasheet; ComponentLink1URL: https://wmsc.lcsc.com/wmsc/upload/file/pdf/v2/lcsc/2304140030_Murata-Electronics-BLM18AG151SN1D_C337878.pdf; ComponentLink2Description: JLCPCB Part URL; ComponentLink2URL: https://jlcpcb.com/partdetail/C337878; ComponentLink3Description: LCSC Part URL; ComponentLink3URL: https://lcsc.com/product-detail/Ferrite-Beads_Murata-Electronics-Murata-Electronics-BLM18AG151SN1D_C337878.html
footprint FB-0603 (0603 (1608M) Ferrite)
pins: 1, 2

## BLM18AG221SH1D
designator FB?  Impedance @ Frequency: 220Ω@100MHz
Ferrite, 220Ω@100MHz, ±25%, 250mΩ, 700mA, SMD 0603; Manufacturer: Murata Electronics; Manufacturer Part Number: BLM18AG221SH1D; Package Size: 0603; JLCPCB Basic Part: No; JLCPCB Part Number: C440130; Supplier 1: LCSC; Category: Ferrite Beads; Supplier Part Number 1: C440130; Tolerance: ±25%; Rated Current: 700mA; DC Resistance: 250mΩ; RoHS: Yes; ComponentLink1Description: Datasheet; ComponentLink1URL: https://wmsc.lcsc.com/wmsc/upload/file/pdf/v2/lcsc/2304140030_Murata-Electronics-BLM18AG221SH1D_C440130.pdf; ComponentLink2Description: JLCPCB Part URL; ComponentLink2URL: https://jlcpcb.com/partdetail/C440130; ComponentLink3Description: LCSC Part URL; ComponentLink3URL: https://lcsc.com/product-detail/Ferrite-Beads_Murata-Electronics-Murata-Electronics-BLM18AG221SH1D_C440130.html
footprint FB-0603 (0603 (1608M) Ferrite)
pins: 1, 2

## BLM18AG221SN1D
designator FB?  Impedance @ Frequency: 220Ω@100MHz
Ferrite, 220Ω@100MHz, ±25%, 250mΩ, 700mA, SMD 0603; Manufacturer: Murata Electronics; Manufacturer Part Number: BLM18AG221SN1D; Package Size: 0603; JLCPCB Basic Part: No; JLCPCB Part Number: C88971; Supplier 1: LCSC; Category: Ferrite Beads; Supplier Part Number 1: C88971; Tolerance: ±25%; Rated Current: 700mA; DC Resistance: 250mΩ; RoHS: Yes; ComponentLink1Description: Datasheet; ComponentLink1URL: https://wmsc.lcsc.com/wmsc/upload/file/pdf/v2/lcsc/2304140030_Murata-Electronics-BLM18AG221SN1D_C88971.pdf; ComponentLink2Description: JLCPCB Part URL; ComponentLink2URL: https://jlcpcb.com/partdetail/C88971; ComponentLink3Description: LCSC Part URL; ComponentLink3URL: https://lcsc.com/product-detail/Ferrite-Beads_Murata-Electronics-Murata-Electronics-BLM18AG221SN1D_C88971.html
footprint FB-0603 (0603 (1608M) Ferrite)
pins: 1, 2

## BLM18AG331SH1D
designator FB?  Impedance @ Frequency: 330Ω@100MHz
Ferrite, 330Ω@100MHz, ±25%, 300mΩ, 600mA, SMD 0603; Manufacturer: Murata Electronics; Manufacturer Part Number: BLM18AG331SH1D; Package Size: 0603; JLCPCB Basic Part: No; JLCPCB Part Number: C417119; Supplier 1: LCSC; Category: Ferrite Beads; Supplier Part Number 1: C417119; Tolerance: ±25%; Rated Current: 600mA; DC Resistance: 300mΩ; RoHS: Yes; ComponentLink1Description: Datasheet; ComponentLink1URL: https://wmsc.lcsc.com/wmsc/upload/file/pdf/v2/lcsc/2304140030_Murata-Electronics-BLM18AG331SH1D_C417119.pdf; ComponentLink2Description: JLCPCB Part URL; ComponentLink2URL: https://jlcpcb.com/partdetail/C417119; ComponentLink3Description: LCSC Part URL; ComponentLink3URL: https://lcsc.com/product-detail/Ferrite-Beads_Murata-Electronics-Murata-Electronics-BLM18AG331SH1D_C417119.html
footprint FB-0603 (0603 (1608M) Ferrite)
pins: 1, 2

## BLM18AG331SN1D
designator FB?  Impedance @ Frequency: 330Ω@100MHz
Ferrite, 330Ω@100MHz, ±25%, 300mΩ, 600mA, SMD 0603; Manufacturer: Murata Electronics; Manufacturer Part Number: BLM18AG331SN1D; Package Size: 0603; JLCPCB Basic Part: No; JLCPCB Part Number: C113010; Supplier 1: LCSC; Category: Ferrite Beads; Supplier Part Number 1: C113010; Tolerance: ±25%; Rated Current: 600mA; DC Resistance: 300mΩ; RoHS: Yes; ComponentLink1Description: Datasheet; ComponentLink1URL: https://wmsc.lcsc.com/wmsc/upload/file/pdf/v2/lcsc/2304140030_Murata-Electronics-BLM18AG331SN1D_C113010.pdf; ComponentLink2Description: JLCPCB Part URL; ComponentLink2URL: https://jlcpcb.com/partdetail/C113010; ComponentLink3Description: LCSC Part URL; ComponentLink3URL: https://lcsc.com/product-detail/Ferrite-Beads_Murata-Electronics-Murata-Electronics-BLM18AG331SN1D_C113010.html
footprint FB-0603 (0603 (1608M) Ferrite)
pins: 1, 2

## BLM18AG331SZ1D
designator FB?  Impedance @ Frequency: 330Ω@100MHz
Ferrite, 330Ω@100MHz, ±25%, 300mΩ, 600mA, SMD 0603; Manufacturer: Murata Electronics; Manufacturer Part Number: BLM18AG331SZ1D; Package Size: 0603; JLCPCB Basic Part: No; JLCPCB Part Number: C413960; Supplier 1: LCSC; Category: Ferrite Beads; Supplier Part Number 1: C413960; Tolerance: ±25%; Rated Current: 600mA; DC Resistance: 300mΩ; RoHS: Yes; ComponentLink1Description: Datasheet; ComponentLink1URL: https://wmsc.lcsc.com/wmsc/upload/file/pdf/v2/lcsc/1912111437_Murata-Electronics-BLM18AG331SZ1D_C413960.pdf; ComponentLink2Description: JLCPCB Part URL; ComponentLink2URL: https://jlcpcb.com/partdetail/C413960; ComponentLink3Description: LCSC Part URL; ComponentLink3URL: https://lcsc.com/product-detail/Ferrite-Beads_Murata-Electronics-Murata-Electronics-BLM18AG331SZ1D_C413960.html
footprint FB-0603 (0603 (1608M) Ferrite)
pins: 1, 2

## BLM18AG471SH1D
designator FB?  Impedance @ Frequency: 470Ω@100MHz
Ferrite, 470Ω@100MHz, ±25%, 350mΩ, 550mA, SMD 0603; Manufacturer: Murata Electronics; Manufacturer Part Number: BLM18AG471SH1D; Package Size: 0603; JLCPCB Basic Part: No; JLCPCB Part Number: C2661475; Supplier 1: LCSC; Category: Ferrite Beads; Supplier Part Number 1: C2661475; Tolerance: ±25%; Rated Current: 550mA; DC Resistance: 350mΩ; RoHS: Yes; ComponentLink1Description: Datasheet; ComponentLink1URL: https://wmsc.lcsc.com/wmsc/upload/file/pdf/v2/lcsc/2304140030_Murata-Electronics-BLM18AG471SH1D_C2661475.pdf; ComponentLink2Description: JLCPCB Part URL; ComponentLink2URL: https://jlcpcb.com/partdetail/C2661475; ComponentLink3Description: LCSC Part URL; ComponentLink3URL: https://lcsc.com/product-detail/Ferrite-Beads_Murata-Electronics-Murata-Electronics-BLM18AG471SH1D_C2661475.html
footprint FB-0603 (0603 (1608M) Ferrite)
pins: 1, 2

## BLM18AG471SN1D
designator FB?  Impedance @ Frequency: 470Ω@100MHz
Ferrite, 470Ω@100MHz, ±25%, 350mΩ, 550mA, SMD 0603; Manufacturer: Murata Electronics; Manufacturer Part Number: BLM18AG471SN1D; Package Size: 0603; JLCPCB Basic Part: No; JLCPCB Part Number: C88972; Supplier 1: LCSC; Category: Ferrite Beads; Supplier Part Number 1: C88972; Tolerance: ±25%; Rated Current: 550mA; DC Resistance: 350mΩ; RoHS: Yes; ComponentLink1Description: Datasheet; ComponentLink1URL: https://wmsc.lcsc.com/wmsc/upload/file/pdf/v2/lcsc/2304140030_Murata-Electronics-BLM18AG471SN1D_C88972.pdf; ComponentLink2Description: JLCPCB Part URL; ComponentLink2URL: https://jlcpcb.com/partdetail/C88972; ComponentLink3Description: LCSC Part URL; ComponentLink3URL: https://lcsc.com/product-detail/Ferrite-Beads_Murata-Electronics-Murata-Electronics-BLM18AG471SN1D_C88972.html
footprint FB-0603 (0603 (1608M) Ferrite)
pins: 1, 2

## BLM18AG471SZ1D
designator FB?  Impedance @ Frequency: 470Ω@100MHz
Ferrite, 470Ω@100MHz, ±25%, 350mΩ, 550mA, SMD 0603; Manufacturer: Murata Electronics; Manufacturer Part Number: BLM18AG471SZ1D; Package Size: 0603; JLCPCB Basic Part: No; JLCPCB Part Number: C883591; Supplier 1: LCSC; Category: Ferrite Beads; Supplier Part Number 1: C883591; Tolerance: ±25%; Rated Current: 550mA; DC Resistance: 350mΩ; RoHS: Yes; ComponentLink1Description: Datasheet; ComponentLink1URL: https://wmsc.lcsc.com/wmsc/upload/file/pdf/v2/lcsc/2201131200_Murata-Electronics-BLM18AG471SZ1D_C883591.pdf; ComponentLink2Description: JLCPCB Part URL; ComponentLink2URL: https://jlcpcb.com/partdetail/C883591; ComponentLink3Description: LCSC Part URL; ComponentLink3URL: https://lcsc.com/product-detail/Ferrite-Beads_Murata-Electronics-Murata-Electronics-BLM18AG471SZ1D_C883591.html
footprint FB-0603 (0603 (1608M) Ferrite)
pins: 1, 2
